# Altium schematic symbol library AD_Lib.SchLib: 1239 symbols (part 9 of 9) (continued)
## Visio_PS
designator PS?, comment PowerSupply  (value not drawn)
¼ÌµçÆ÷, 2NC2NO; Manufacturer: TE Connectivity; pro-environment: RoHS; Quality: -40~85¡æ; Vaule: 2A-30VDC, 5V; OPN: IM03GR; PadsNum: 0; SN: SN; Part: IM03GR; Category: ¼ÌµçÆ÷; QTY: 1000; Price: 15.8878; OPN_JLC: OPN_JLC; SN_JLC: SN_JLC; Price_JLC: 0
footprint IM_G (Footprint not found)
pins: 24V, 110V 1
text: Power

## Visio_RY1
designator RY?, comment LC1D18BD
¼ÌµçÆ÷, 2NC2NO; Manufacturer: TE Connectivity; pro-environment: RoHS; Quality: -40~85¡æ; Vaule: 2A-30VDC, 5V; OPN: IM03GR; PadsNum: 0; SN: SN; Part: IM03GR; Category: ¼ÌµçÆ÷; QTY: 1000; Price: 15.8878; OPN_JLC: OPN_JLC; SN_JLC: SN_JLC; Price_JLC: 0
footprint IM_G (Footprint not found)
part A pins: A1 IN+, A2 IN-
part B pins: 1L1, 2T1

## Visio_RY2
designator RY?, comment IM03GR
¼ÌµçÆ÷, 2NC2NO; Manufacturer: TE Connectivity; pro-environment: RoHS; Quality: -40~85¡æ; Vaule: 2A-30VDC, 5V; PadsNum: 0; SN: SN; OPN: IM03GR; Part: IM03GR; Category: ¼ÌµçÆ÷; QTY: 1000; Price: 15.8878; OPN_JLC: OPN_JLC; SN_JLC: SN_JLC; Price_JLC: 0
footprint IM_G (Footprint not found)
part A pins: 1 IN+, 8 IN-
part B pins: 2, 3, 4
part C pins: 5, 6, 7

## Visio_TimeSW
designator TR?, comment 3RP1525-1BW30
¼ÌµçÆ÷, 2NC2NO; Manufacturer: TE Connectivity; pro-environment: RoHS; Quality: -40~85¡æ; Vaule: 2A-30VDC, 5V; OPN: IM03GR; PadsNum: 0; SN: SN; Part: IM03GR; Category: ¼ÌµçÆ÷; QTY: 1000; Price: 15.8878; OPN_JLC: OPN_JLC; SN_JLC: SN_JLC; Price_JLC: 0
footprint IM_G (Footprint not found)
pins: 15 1, 18 2
text: Time; Relay

## Y_ABL-20.000MHZ-D2
designator Y?, comment 20MHz
¾§Õñ; Manufacturer: Abracon; Quality: -40~85¡æ; SN: 03.4.40.11.99200005S; pro-environment: RoHS; OPN: ABL-20.000MHZ-D2; other: ¸ºÔØµçÈÝ=18pF;ÈÝ²î=20ppm;ESR=40¦¸; PadsNum: 0; Category: ¾§Õñ; Part: 20MHz; Value: 20MHz; QTY: 1000; Price: 1.4274; OPN_JLC: OPN_JLC; SN_JLC: SN_JLC; Price_JLC: 0
footprint XTAL_TH (ÎÞÔ´¾§Õñ£¬Ö±²å)
pins: 1, 2

## Y_ABM3-10.0000MHZ-D2Y-T
designator Y?, comment 10MHz
¾§Õñ; Manufacturer: Abracon; Quality: -40~85¡æ; SN: 03.4.40.11.85100001S; pro-environment: RoHS; OPN: ABM3-10.0000MHZ-D2Y-T; other: ¸ºÔØµçÈÝ=18pF;ÈÝ²î=20ppm;ESR=60¦¸; PadsNum: 0; Category: ¾§Õñ; Part: 10MHz; Value: 10MHz; QTY: 1000; Price: ?; OPN_JLC: OPN_JLC; SN_JLC: SN_JLC; Price_JLC: 0
footprint ABM3 (ABM3-40.000MHZ-D2Y-T)
pins: 1, 2

## Y_ABM3-25.000MHZ-D2Y-T
designator Y?, comment 25MHz
¾§Õñ; Manufacturer: Abracon; Quality: -40~85¡æ; pro-environment: RoHS; OPN: ABM3-25.000MHZ-D2Y-T; other: ¸ºÔØµçÈÝ=18pF;ÈÝ²î=20ppm;ESR=30¦¸; PadsNum: 2; SN: SN; Category: ¾§Õñ; Part: 25MHz; Value: 25MHz; QTY: 1000; Price: -; OPN_JLC: X503225MSB2GI; SN_JLC: C112569; Price_JLC: 1.0077
footprint Y_SMD5032 (ABM3-40.000MHZ-D2Y-T£¬5032·â×°)
pins: 1, 2

## Y_ABM3-40.000MHZ-D2Y-T
designator Y?, comment 40MHz
¾§Õñ; Manufacturer: Abracon; Quality: -40~85¡æ; SN: 03.4.30.11.12040M01S; pro-environment: RoHS; OPN: ABM3-40.000MHZ-D2Y-T; PadsNum: 0; Part: 40MHz; Category: ¾§Õñ; Value: 40MHz; QTY: 1000; Price: ?; OPN_JLC: OPN_JLC; SN_JLC: SN_JLC; Price_JLC: 0
footprint ABM3 (ABM3-40.000MHZ-D2Y-T)
pins: 1, 2

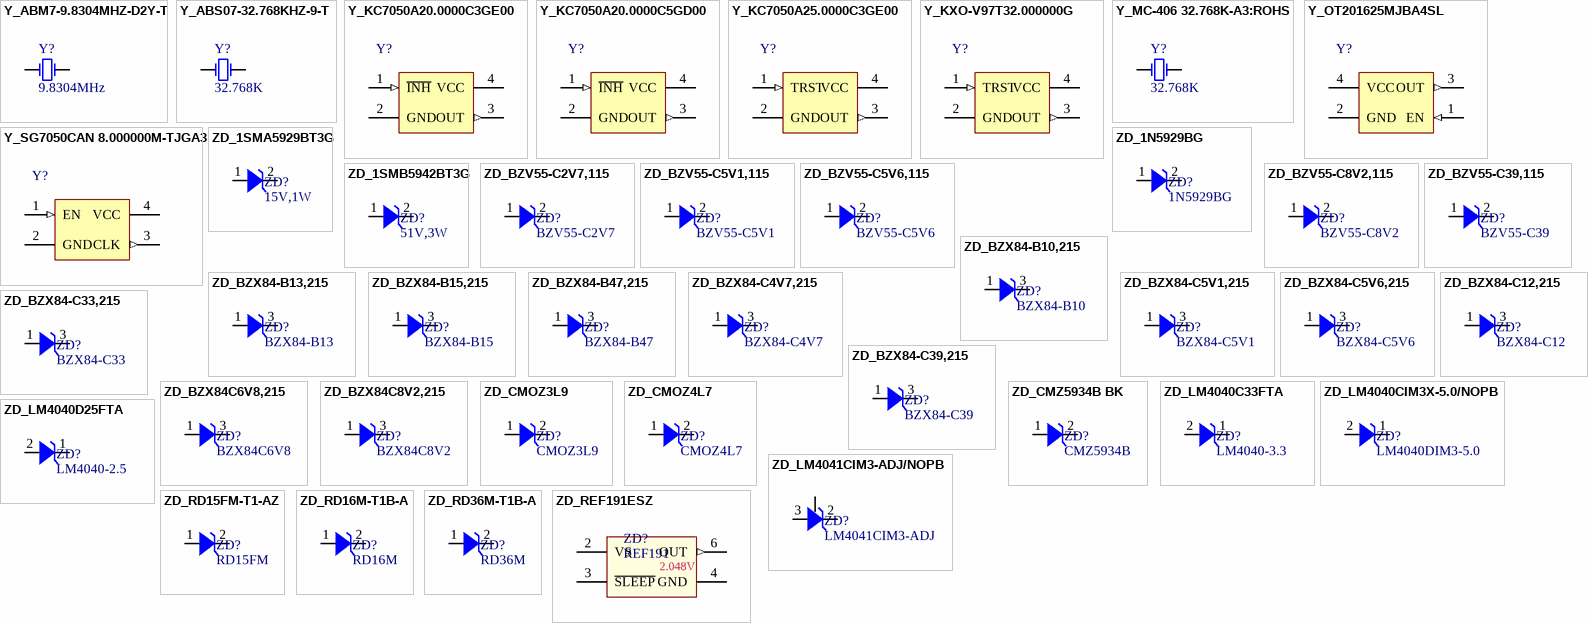
[diagram p41: symbols Y_ABM7-9.8304MHZ-D2Y-T to ZD_REF191ESZ]

## Y_ABM7-9.8304MHZ-D2Y-T
designator Y?, comment 9.8304MHz
¾§Õñ; Manufacturer: Abracon; Quality: -40~85¡æ; SN: 03.4.40.11.85983401S; pro-environment: RoHS; OPN: ABM7-9.8304MHZ-D2Y-T; other: ¸ºÔØµçÈÝ=18pF;ÈÝ²î=20ppm;ESR=100¦¸; PadsNum: 0; Category: ¾§Õñ; Part: 9.8304MHz; Value: 9.8304MHz; QTY: 1000; Price: ?; OPN_JLC: OPN_JLC; SN_JLC: SN_JLC; Price_JLC: 0
footprint ABM7
pins: 1, 2

## Y_ABS07-32.768KHZ-9-T
designator Y?, comment 32.768K
¾§Õñ; 32.768kHz;; Manufacturer: Abracon; Quality: -40~85¡æ; pro-environment: RoHS; OPN: ABS07-32.768KHZ-9-T; other: ÈÝ²î=20ppm;ÆµÂÊÎÈ¶¨ÐÔ=20ppm; PadsNum: 2; SN: SN; Category: ¾§Õñ; Part: 32.768K; Value: 32.768KHz; QTY: 3000; Price: 2.8665; OPN_JLC: SF32WK32768D31T002; SN_JLC: C271654; Price_JLC: 1.71
footprint Y_SMD3215 (Footprint not found)
pins: 1, 2

## Y_KC7050A20.0000C3GE00
designator Y?, comment 20M,5V  (value not drawn)
¾§Õñ,ÓÐÔ´,20MHz,3.14~3.46V; Manufacturer: AVX; Quality: -40~85¡æ; SN: 03.4.40.11.99200002S; OPN: KC7050A20.0000C3GE00; Other: 20M,3.3V,50ppm; Pro-environment: RoHS; PadsNum: 0; Value: 20M,5V; Category: ¾§Õñ; Part: KC7050A20.0000C3GE00; QTY: 1000; Price: 7.1604; OPN_JLC: OPN_JLC; SN_JLC: SN_JLC; Price_JLC: 0
footprint Y_7050 (Footprint not found)
pins: 1 ~{INH} (in), 2 GND (power), 3 OUT (out), 4 VCC (power)

## Y_KC7050A20.0000C5GD00
designator Y?, comment 20M,5V  (value not drawn)
¾§Õñ,ÓÐÔ´,20MHz,4.5~5.5V; Manufacturer: AVX; Quality: -40~85¡æ; SN: 03.4.40.11.99200003S; OPN: KC7050A20.0000C5GD00; Other: 20M,5V,50ppm; Pro-environment: RoHS; PadsNum: 0; Value: 20M,5V; Category: ¾§Õñ; Part: KC7050A20.0000C5GD00; QTY: 1000; Price: 14.0166; OPN_JLC: OPN_JLC; SN_JLC: SN_JLC; Price_JLC: 0
footprint Y_7050 (AVXÖ®KC7050AÏµÁÐÓÐÔ´¾§Õñ£¬7.0¡Á5.0mm SMD)
pins: 1 ~{INH} (in), 2 GND (power), 3 OUT (out), 4 VCC (power)

## Y_KC7050A25.0000C3GE00
designator Y?, comment 25MHz,3.3V  (value not drawn)
¾§Õñ;ÓÐÔ´;25MHz;3.3V; Manufacturer: AVX; Quality: -40~85¡æ; OPN: KC7050A25.0000C3GE00; Pro-environment: RoHS; PadsNum: 0; Value: 25MHz,3.3V; SN: SN; Category: ¾§Õñ; Other: 25MHz,3.3V; Part: KC7050A25.0000C3GE00; QTY: 1000; Price: 7.3827; OPN_JLC: OPN_JLC; SN_JLC: SN_JLC; Price_JLC: 0
footprint Y_7050 (AVXÖ®KC7050AÏµÁÐÓÐÔ´¾§Õñ£¬7.0¡Á5.0mm SMD)
pins: 1 TRST (in), 2 GND (power), 3 OUT (out), 4 VCC (power)

## Y_KXO-V97T32.000000G
designator Y?, comment 32M,3.3V  (value not drawn)
¾§Õñ;ÓÐÔ´;32M;3.3V; Manufacturer: Keyer; Quality: -40~85¡æ; OPN: KXO-V97T32.000000G; Pro-environment: RoHS; PadsNum: 0; Value: 32M,3.3V; SN: SN; Category: ¾§Õñ; Other: 32M,3.3V; Part: KXO-V97T32.000000G; QTY: 1000; Price: ?; OPN_JLC: OPN_JLC; SN_JLC: SN_JLC; Price_JLC: 0
footprint Y_7050 (AVXÖ®KC7050AÏµÁÐÓÐÔ´¾§Õñ£¬7.0¡Á5.0mm SMD)
pins: 1 TRST (in), 2 GND (power), 3 OUT (out), 4 VCC (power)

## Y_MC-406 32.768K-A3:ROHS
designator Y?, comment 32.768K
¾§Õñ; Manufacturer: Epson; Quality: -40~85¡æ; SN: 03.4.40.11.99MC4001S; pro-environment: RoHS; OPN: MC-406 32.768K-A3:ROHS; Value: 32.768KHz; other: ÈÝ²î=20ppm;ÆµÂÊÎÈ¶¨ÐÔ=100ppm; PadsNum: 0; Category: ¾§Õñ; Part: 32.768K; QTY: 250; Price: 5.6745; OPN_JLC: OPN_JLC; SN_JLC: SN_JLC; Price_JLC: 0
footprint MC406 (EpsonÖ®MC406ÏµÁÐ¾§Õñ£¬10.41*4.06*3.6mm)
pins: 1, 4

## Y_OT201625MJBA4SL
designator Y?, comment 25MHz,3.3V  (value not drawn)
¾§Õñ; ÓÐÔ´; 25MHz; 1.8~3.3V; Manufacturer: YXCÑïÐË¿Æ¼¼; Quality: -40~85¡æ; OPN: OT201625MJBA4SL; Pro-environment: RoHS; PadsNum: 4; Value: 25MHz,3.3V; SN: SN; Category: ¾§Õñ; Other: 25MHz,3.3V; Part: OT201625MJBA4SL; QTY: 1000; Price: 3.11; OPN_JLC: OT201625MJBA4SL; SN_JLC: C669080; Price_JLC: 3.11
footprint Y_2016 (4PÓÐÔ´¾§Õñ£¬2.0¡Á1.6mm SMD)
pins: 1 EN (in), 2 GND (power), 3 OUT (out), 4 VCC (power)

## Y_SG7050CAN 8.000000M-TJGA3
designator Y?, comment 8M,2.5V  (value not drawn)
¾§Õñ:ÓÐÔ´;8M;2.5V; Manufacturer: EPSON; Quality: -40~85¡æ; OPN: SG7050CAN 8.000000M-TJGA3; Pro-environment: RoHS; PadsNum: 0; Value: 8M,2.5V; SN: SN; Category: ¾§Õñ; Other: 8M,2.5V; Part: SG7050CAN 8.000000M-TJGA3; Price: ?; OPN_JLC: OPN_JLC; SN_JLC: SN_JLC; Price_JLC: 0
footprint Y_7050 (AVXÖ®KC7050AÏµÁÐÓÐÔ´¾§Õñ£¬7.0¡Á5.0mm SMD)
pins: 1 EN (in), 2 GND (power), 3 CLK (out), 4 VCC (power)

## ZD_1N5929BG
designator ZD?, comment 1N5929BG
ÎÈÑ¹¶þ¼«¹Ü,15V,3W; Manufacturer: Renesas; pro-environment: RoHS; Quality: -65~200¡æ; SN: 03.4.21.13.99592901S; Value: 15V,3W; other: Tol=5%; PadsNum: 0; OPN: 1N5929BG; Part: 1N5929BG; Category: ÎÈÑ¹¶þ¼«¹Ü; QTY: 2000; Price: 0.6552; OPN_JLC: OPN_JLC; SN_JLC: SN_JLC; Price_JLC: 0
footprint DO-41B (Diode, Axial; Body 5.2 x 2.7 mm (LxDia. max), Lead Dia. 0.86 mm (max))
pins: 1 "A", 2 "K"

## ZD_1SMA5929BT3G
designator ZD?, comment 15V,1W
ÎÈÑ¹¶þ¼«¹Ü; 15V; 5%; 1.5W; Manufacturer: ON; pro-environment: RoHS; Quality: -65~150¡æ; OPN: 1SMA5929BT3G; other: Tol=5%; PadsNum: 2; SN: SN; Value: 15V,1W; Part: 15V,1W; Category: ÎÈÑ¹¶þ¼«¹Ü; QTY: 5000; Price: 0.70964; OPN_JLC: 1SMA5929BT3G; SN_JLC: C32357; Price_JLC: 0.466469
footprint SMA (DO-214-AC/SMA)
pins: 1 "A", 2 "K"

## ZD_1SMB5942BT3G
designator ZD?, comment 51V,3W
ÎÈÑ¹¶þ¼«¹Ü; 51V; 5%; 3W; Manufacturer: ON; pro-environment: RoHS; Quality: -65~150¡æ; OPN: 1SMB5942BT3G; other: Tol=5%; PadsNum: 2; SN: SN; Value: 51V,3W; Part: 51V,3W; Category: ÎÈÑ¹¶þ¼«¹Ü; QTY: 2500; Price: 0.79439; OPN_JLC: 1SMB5942BT3G; SN_JLC: C152465; Price_JLC: 0.7161
footprint SMB (DO-214-AA/SMB)
pins: 1 "A", 2 "K"

## ZD_BZV55-C2V7,115
designator ZD?, comment BZV55-C2V7
ÎÈÑ¹¶þ¼«¹Ü,2.9V; 0.5W; Manufacturer: Nexperia; pro-environment: RoHS; Quality: -55~150¡æ; SN: 03.4.21.13.99C2V701S; Value: 2.9V,0.5W; OPN: BZV55-C2V7,115; other: Vz=2.9V;ÈÝ²î=5%; PadsNum: 0; Part: BZV55-C2V7; Category: ÎÈÑ¹¶þ¼«¹Ü; QTY: 2500; Price: 0.25038; OPN_JLC: OPN_JLC; SN_JLC: SN_JLC; Price_JLC: 0
footprint SOD-80 (Footprint not found)
pins: 1 "A", 2 "K"

## ZD_BZV55-C5V1,115
designator ZD?, comment BZV55-C5V1
ÎÈÑ¹¶þ¼«¹Ü; 5.1V; 0.5W; Manufacturer: Nexperia; pro-environment: RoHS; Quality: -55~150¡æ; SN: 03.4.21.13.99C5V101S; Value: 5.1V,0.5W; OPN: BZV55-C5V1,115; other: ÈÝ²î=5%; PadsNum: 0; Part: BZV55-C5V1; Category: ÎÈÑ¹¶þ¼«¹Ü; QTY: 2500; Price: 0.25038; OPN_JLC: OPN_JLC; SN_JLC: SN_JLC; Price_JLC: 0
footprint SOD-80 (Footprint not found)
pins: 1 "A", 2 "K"

## ZD_BZV55-C5V6,115
designator ZD?, comment BZV55-C5V6
ÎÈÑ¹¶þ¼«¹Ü; 5.6V; 0.5W; Manufacturer: Nexperia; pro-environment: RoHS; Quality: -55~150¡æ; SN: 03.4.21.13.99C5V601S; Value: 5.6V,0.5W; OPN: BZV55-C5V6,115; other: ÈÝ²î=5%; PadsNum: 0; Part: BZV55-C5V6; Category: ÎÈÑ¹¶þ¼«¹Ü; QTY: 2500; Price: 0.25038; OPN_JLC: OPN_JLC; SN_JLC: SN_JLC; Price_JLC: 0
footprint SOD-80 (Footprint not found)
pins: 1 "A", 2 "K"

## ZD_BZV55-C8V2,115
designator ZD?, comment BZV55-C8V2
ÎÈÑ¹¶þ¼«¹Ü;8.2V;0.5W; Manufacturer: Nexperia; pro-environment: RoHS; Quality: -55~150¡æ; Value: 8.2V,0.5W; OPN: BZV55-C8V2,115; other: Vz=8.2V;ÈÝ²î=5%; PadsNum: 0; SN: SN; Part: BZV55-C8V2; Category: ÎÈÑ¹¶þ¼«¹Ü; QTY: 2500; Price: 0.25038; OPN_JLC: OPN_JLC; SN_JLC: SN_JLC; Price_JLC: 0
footprint SOD-80 (Footprint not found)
pins: 1 "A", 2 "K"

## ZD_BZV55-C39,115
designator ZD?, comment BZV55-C39
ÎÈÑ¹¶þ¼«¹Ü,41V; Manufacturer: Nexperia; pro-environment: RoHS; Quality: -55~150¡æ; SN: 03.4.21.13.990C3901S; Value: 39V,0.5W; OPN: BZV55-C39,115; other: Vz=41V;ÈÝ²î=5%; PadsNum: 0; Part: BZV55-C39; Category: ÎÈÑ¹¶þ¼«¹Ü; QTY: 2500; Price: 0.25038; OPN_JLC: OPN_JLC; SN_JLC: SN_JLC; Price_JLC: 0
footprint SOD-80 (Footprint not found)
pins: 1 "A", 2 "K"

## ZD_BZX84-B10,215
designator ZD?, comment BZX84-B10
ÎÈÑ¹¶þ¼«¹Ü; Manufacturer: NXP; pro-environment: RoHS; Quality: -65~150¡æ; Value: 10V,0.25W; OPN: BZX84-B10,215; other: Tol=2%; PadsNum: 0; SN: SN; Part: BZX84-B10; Category: ÎÈÑ¹¶þ¼«¹Ü; QTY: 3000; Price: ?; OPN_JLC: OPN_JLC; SN_JLC: SN_JLC; Price_JLC: 0
footprint SOT23-3 (SOT-23; 3 Leads; Body 3.0 x 2.5 mm, inc. leads (LxW max))
pins: 1 "A", 3 "K"

## ZD_BZX84-B13,215
designator ZD?, comment BZX84-B13
ÎÈÑ¹¶þ¼«¹Ü; Manufacturer: NXP; pro-environment: RoHS; Quality: -65~125¡æ; SN: 03.4.21.13.48841301S; Value: 13V,0.25W; OPN: BZX84-B13,215; other: 2%;MARK=*Z8; PadsNum: 0; Part: BZX84-B13; Category: ÎÈÑ¹¶þ¼«¹Ü; QTY: 3000; Price: 0.25389; OPN_JLC: OPN_JLC; SN_JLC: SN_JLC; Price_JLC: 0
footprint SOT23-3 (SOT-23; 3 Leads; Body 3.0 x 2.5 mm, inc. leads (LxW max))
pins: 1 "A", 3 "K"

## ZD_BZX84-B15,215
designator ZD?, comment BZX84-B15
ÎÈÑ¹¶þ¼«¹Ü; Manufacturer: NXP; pro-environment: RoHS; Quality: -65~150¡æ; SN: 03.4.21.13.48841501S; Value: 15V,0.25W; OPN: BZX84-B15,215; other: Tol=2%; PadsNum: 0; Part: BZX84-B15; Category: ÎÈÑ¹¶þ¼«¹Ü; QTY: 3000; Price: ?; OPN_JLC: OPN_JLC; SN_JLC: SN_JLC; Price_JLC: 0
footprint SOT23-3 (SOT-23; 3 Leads; Body 3.0 x 2.5 mm, inc. leads (LxW max))
pins: 1 "A", 3 "K"

## ZD_BZX84-B47,215
designator ZD?, comment BZX84-B47
ÎÈÑ¹¶þ¼«¹Ü; Manufacturer: NXP; pro-environment: RoHS; Quality: -65~150¡æ; Value: 47V,0.25W; OPN: BZX84-B47,215; other: Tol=2%; PadsNum: 0; SN: SN; Part: BZX84-B47; Category: ÎÈÑ¹¶þ¼«¹Ü; QTY: 3000; Price: ?; OPN_JLC: OPN_JLC; SN_JLC: SN_JLC; Price_JLC: 0
footprint SOT23-3 (SOT-23; 3 Leads; Body 3.0 x 2.5 mm, inc. leads (LxW max))
pins: 1 "A", 3 "K"

## ZD_BZX84-C4V7,215
designator ZD?, comment BZX84-C4V7
ÎÈÑ¹¶þ¼«¹Ü; Manufacturer: NXP; pro-environment: RoHS; Quality: -65~125¡æ; Value: 4.7V,0.25W; OPN: BZX84-C4V7,215; PadsNum: 0; SN: SN; Part: BZX84-C4V7; Category: ÎÈÑ¹¶þ¼«¹Ü; QTY: 3000; Price: ?; OPN_JLC: OPN_JLC; SN_JLC: SN_JLC; Price_JLC: 0
footprint SOT23-3 (SOT-23; 3 Leads; Body 3.0 x 2.5 mm, inc. leads (LxW max))
pins: 1 "A", 3 "K"

## ZD_BZX84-C5V1,215
designator ZD?, comment BZX84-C5V1
ÎÈÑ¹¶þ¼«¹Ü; Manufacturer: NXP; pro-environment: RoHS; Quality: -65~125¡æ; SN: 03.4.21.13.48C5V102S; Value: 5.1V,0.25W; OPN: BZX84-C5V1,215; other: ÈÝ²î=5%; PadsNum: 0; Part: BZX84-C5V1; Category: ÎÈÑ¹¶þ¼«¹Ü; QTY: 3000; Price: ?; OPN_JLC: OPN_JLC; SN_JLC: SN_JLC; Price_JLC: 0
footprint SOT23-3 (SOT-23; 3 Leads; Body 3.0 x 2.5 mm, inc. leads (LxW max))
pins: 1 "A", 3 "K"

## ZD_BZX84-C5V6,215
designator ZD?, comment BZX84-C5V6
ÎÈÑ¹¶þ¼«¹Ü; Manufacturer: NXP; pro-environment: RoHS; Quality: -65~125¡æ; SN: 03.4.21.13.53C5V601S; Value: 5.6V,0.25W; OPN: BZX84-C5V6,215; other: ÈÝ²î=5%; PadsNum: 0; Part: BZX84-C5V6; Category: ÎÈÑ¹¶þ¼«¹Ü; QTY: 3000; Price: ?; OPN_JLC: OPN_JLC; SN_JLC: SN_JLC; Price_JLC: 0
footprint SOT23-3 (SOT-23; 3 Leads; Body 3.0 x 2.5 mm, inc. leads (LxW max))
pins: 1 "A", 3 "K"

## ZD_BZX84-C12,215
designator ZD?, comment BZX84-C12
ÎÈÑ¹¶þ¼«¹Ü; Manufacturer: NXP; pro-environment: RoHS; Quality: -65~125¡æ; Value: 12V,0.25W; OPN: BZX84-C12,215; other: 5%;MARK=Y2*; PadsNum: 0; SN: SN; Part: BZX84-C12; Category: ÎÈÑ¹¶þ¼«¹Ü; QTY: 3000; Price: ?; OPN_JLC: OPN_JLC; SN_JLC: SN_JLC; Price_JLC: 0
footprint SOT23-3 (SOT-23; 3 Leads; Body 3.0 x 2.5 mm, inc. leads (LxW max))
pins: 1 "A", 3 "K"

## ZD_BZX84-C33,215
designator ZD?, comment BZX84-C33
ÎÈÑ¹¶þ¼«¹Ü; Manufacturer: NXP; pro-environment: RoHS; Quality: -65~150¡æ; SN: 03.4.21.13.484C3301S; Value: 33V,0.25W; OPN: BZX84-C33,215; other: 5%;MARK=*T6; PadsNum: 0; Part: BZX84-C33; Category: ÎÈÑ¹¶þ¼«¹Ü; QTY: 3000; Price: 0.18486; OPN_JLC: OPN_JLC; SN_JLC: SN_JLC; Price_JLC: 0
footprint SOT23-3 (SOT-23; 3 Leads; Body 3.0 x 2.5 mm, inc. leads (LxW max))
pins: 1 "A", 3 "K"

## ZD_BZX84-C39,215
designator ZD?, comment BZX84-C39
ÎÈÑ¹¶þ¼«¹Ü; Manufacturer: NXP; pro-environment: RoHS; Quality: -55~150¡æ; SN: 03.4.21.13.484C3902S; Value: 39V,0.25W; OPN: BZX84-C39,215; other: 5%;MARK=*T8; PadsNum: 0; Part: BZX84-C39; Category: ÎÈÑ¹¶þ¼«¹Ü; QTY: 3000; Price: 0.19422; OPN_JLC: OPN_JLC; SN_JLC: SN_JLC; Price_JLC: 0
footprint SOT23-3 (SOT-23; 3 Leads; Body 3.0 x 2.5 mm, inc. leads (LxW max))
pins: 1 "A", 3 "K"

## ZD_BZX84C6V8,215
designator ZD?, comment BZX84C6V8
ÎÈÑ¹¶þ¼«¹Ü; Manufacturer: NXP; pro-environment: RoHS; Quality: -55~150¡æ; Value: 6.8V,0.25W; OPN: BZX84C6V8,215; other: ÈÝ²î=5%; PadsNum: 0; SN: SN; Part: BZX84C6V8; Category: ÎÈÑ¹¶þ¼«¹Ü; QTY: 3000; Price: 0.18486; OPN_JLC: OPN_JLC; SN_JLC: SN_JLC; Price_JLC: 0
footprint SOT23-3 (SOT-23; 3 Leads; Body 3.0 x 2.5 mm, inc. leads (LxW max))
pins: 1 "A", 3 "K"

## ZD_BZX84C8V2,215
designator ZD?, comment BZX84C8V2
ÎÈÑ¹¶þ¼«¹Ü; Manufacturer: NXP; pro-environment: RoHS; Quality: -55~150¡æ; Value: 8.2V,0.25W; OPN: BZX84C8V2,215; other: ÈÝ²î=5%; PadsNum: 0; SN: SN; Part: BZX84C8V2; Category: ÎÈÑ¹¶þ¼«¹Ü; QTY: 3000; Price: 0.18486; OPN_JLC: OPN_JLC; SN_JLC: SN_JLC; Price_JLC: 0
footprint SOT23-3 (SOT-23; 3 Leads; Body 3.0 x 2.5 mm, inc. leads (LxW max))
pins: 1 "A", 3 "K"

## ZD_CMOZ3L9
designator ZD?, comment CMOZ3L9
3.9V, 250mW, SURFACE MOUNT / LOW LEVEL SILICON ZENER DIODE; Manufacturer: ON; pro-environment: RoHS; Quality: -65~150°C; Value: 3V9,250mW; other: Tol=5%; PadsNum: 2; SN: SN; OPN: CMOZ3L9; Part: CMOZ3L9; Category: Zener Diodes; QTY: 5000; Price: 0.70964; OPN_JLC: CMOZ3L9; Price_JLC: 0.466469
footprint SOD523 (SOD-523; 2 Leads; Body 1.2x 0.8 mm, (LxW))
pins: 1 "A", 2 "K"

## ZD_CMOZ4L7
designator ZD?, comment CMOZ4L7
4.7V, 250mW, SURFACE MOUNT / LOW LEVEL SILICON ZENER DIODE; Manufacturer: ON; pro-environment: RoHS; Quality: -65~150°C; Value: 4V7,250mW; other: Tol=5%; PadsNum: 2; SN: SN; OPN: CMOZ4L7; Part: CMOZ4L7; Category: Zener Diodes; QTY: 5000; Price: 0.70964; OPN_JLC: CMOZ4L7; Price_JLC: 0.466469
footprint SOD523 (SOD-523; 2 Leads; Body 1.2x 0.8 mm, (LxW))
pins: 1 "A", 2 "K"

## ZD_CMZ5934B BK
designator ZD?, comment CMZ5934B
ÎÈÑ¹¶þ¼«¹Ü; Manufacturer: Central; pro-environment: RoHS; Quality: -55~150¡æ; Value: 24V,1.5W; OPN: CMZ5934B BK; other: Tol=5%; PadsNum: 0; SN: SN; Part: CMZ5934B; Category: ÎÈÑ¹¶þ¼«¹Ü; QTY: 800; Price: 3.3462; OPN_JLC: OPN_JLC; SN_JLC: SN_JLC; Price_JLC: 0
footprint SMA (DO-214-AC/SMA)
pins: 1 "A", 2 "K"

## ZD_LM4040C33FTA
designator ZD?, comment LM4040-3.3
µçÑ¹²Î¿¼Ô´; 3.3V; 15mA; 0.5%; Manufacturer: TI; pro-environment: RoHS; Quality: -40~125¡æ; Value: 3.3V,15mA; OPN: LM4040C33FTA; other: Vref=3.3V;Ir=62uA~15mA; 0.5%;100ppm;; PadsNum: 3; SN: SN; Part: LM4040-3.3; Category: ÎÈÑ¹¶þ¼«¹Ü; QTY: 3000; Price: 1.8645; OPN_JLC: OPN_JLC; SN_JLC: SN_JLC; Price_JLC: -
footprint SOT23-3 (SOT-23; 3 Leads; Body 3.0 x 2.5 mm, inc. leads (LxW max))
pins: 1 "K", 2 "A"

## ZD_LM4040CIM3X-5.0/NOPB
designator ZD?, comment LM4040DIM3-5.0
µçÑ¹²Î¿¼Ô´,5.0V,15mA,0.5%; Manufacturer: TI; pro-environment: RoHS; Quality: -40~85¡æ; SN: 03.4.11.13.48M32501S; OPN: LM4040CIM3X-5.0/NOPB; other: Vref=5.0V;Ir=15mA; 0.5%;150ppm;; PadsNum: 0; Value: 5.0V,15mA; Part: LM4040DIM3-5.0; Category: ÎÈÑ¹¶þ¼«¹Ü; QTY: 3000; Price: 1.8984; OPN_JLC: OPN_JLC; SN_JLC: SN_JLC; Price_JLC: 0
footprint SOT23-3 (SOT-23; 3 Leads; Body 3.0 x 2.5 mm, inc. leads (LxW max))
pins: 1 "K", 2 "A"

## ZD_LM4040D25FTA
designator ZD?, comment LM4040-2.5
µçÑ¹²Î¿¼Ô´; 2.5V; 15mA; 1%; Manufacturer: Diodes; pro-environment: RoHS; Quality: -40~125¡æ; Value: 2.5V,15mA; OPN: LM4040D25FTA; other: Vref=2.5V;Ir=60uA~15mA; 1%; 150ppm;; PadsNum: 3; SN: SN; Part: LM4040-2.5; Category: ÎÈÑ¹¶þ¼«¹Ü; QTY: 3000; Price: 1.4577; OPN_JLC: LM4040D25FTA; SN_JLC: C107244; Price_JLC: 1.71
footprint SOT23-3 (SOT-23; 3 Leads; Body 3.0 x 2.5 mm, inc. leads (LxW max))
pins: 1 "K", 2 "A"

## ZD_LM4041CIM3-ADJ/NOPB
designator ZD?, comment LM4041CIM3-ADJ
µçÑ¹²Î¿¼Ô´,1.24~10V,12mA; Manufacturer: TI; pro-environment: RoHS; Quality: -40~85¡æ; SN: 03.4.11.13.48404101S; OPN: LM4041CIM3-ADJ/NOPB; other: 1.24~10V;Ir=60uA~12mA; 0.5%;20ppm;; PadsNum: 0; Value: 1.24~10V,12mA; Part: LM4041CIM3-ADJ; Category: ÎÈÑ¹¶þ¼«¹Ü; QTY: 1000; Price: 3.0537; OPN_JLC: OPN_JLC; SN_JLC: SN_JLC; Price_JLC: 0
footprint SO-4W (Pitch=100mil£¬ÈçHCPL-181)
pins: 1 "FB", 2 "K", 3 "A"

## ZD_RD15FM-T1-AZ
designator ZD?, comment RD15FM
ÎÈÑ¹¶þ¼«¹Ü; Manufacturer: Renesas; pro-environment: RoHS; Quality: -55~150¡æ; SN: 03.4.21.13.45RD1501S; Value: 15V,1W; OPN: RD15FM-T1-AZ; other: Tol=?%; PadsNum: 0; Part: RD15FM; Category: ÎÈÑ¹¶þ¼«¹Ü; QTY: 3000; Price: ?; OPN_JLC: OPN_JLC; SN_JLC: SN_JLC; Price_JLC: 0
footprint SMB (DO-214-AA/SMB)
pins: 1 "A", 2 "K"

## ZD_RD16M-T1B-A
designator ZD?, comment RD16M
ÎÈÑ¹¶þ¼«¹Ü; Manufacturer: Renesas; pro-environment: RoHS; Quality: -55~150¡æ; SN: 03.4.21.13.21001601S; Value: 16V,1W; OPN: RD16M-T1B-A; other: Tol=?%; PadsNum: 0; Part: RD16M; Category: ÎÈÑ¹¶þ¼«¹Ü; QTY: 3000; Price: ?; OPN_JLC: OPN_JLC; SN_JLC: SN_JLC; Price_JLC: 0
footprint SMB (DO-214-AA/SMB)
pins: 1 "A", 2 "K"

## ZD_RD36M-T1B-A
designator ZD?, comment RD36M
ÎÈÑ¹¶þ¼«¹Ü; Manufacturer: Renesas; pro-environment: RoHS; Quality: -55~150¡æ; Value: 36V,1W; OPN: RD36M-T1B-A; other: Tol=?%; PadsNum: 0; SN: SN; Part: RD36M; Category: ÎÈÑ¹¶þ¼«¹Ü; QTY: 3000; Price: ?; OPN_JLC: OPN_JLC; SN_JLC: SN_JLC; Price_JLC: 0
footprint SMB (DO-214-AA/SMB)
pins: 1 "A", 2 "K"

## ZD_REF191ESZ
designator ZD?, comment REF191
µçÑ¹²Î¿¼Ô´,2.048V,30mA; Manufacturer: ADI; pro-environment: RoHS; Quality: -40~125¡æ; SN: 03.4.11.11.83191E01S; OPN: REF191ESZ; other: 2.048V,30mA; Vin<18V;5ppm; PadsNum: 0; Value: 2.048V,30mA; Part: REF191; Category: ÎÈÑ¹¶þ¼«¹Ü; QTY: 98; Price: 33.7896; OPN_JLC: OPN_JLC; SN_JLC: SN_JLC; Price_JLC: 0
footprint SO-8 (SOIC, 8-Leads, Body 4.9x3.9mm, Pitch 1.27mm, IPC Low Density)
pins: 2 VS (power), 3 ~{SLEEP} (oc), 4 GND (power), 6 OUT (out)
text: 2.048V

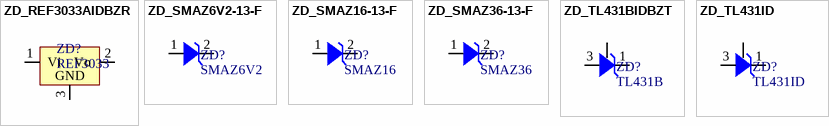
[diagram p42: symbols ZD_REF3033AIDBZR to ZD_TL431ID]

## ZD_REF3033AIDBZR
designator ZD?, comment REF3033
µçÑ¹²Î¿¼Ô´; 0.2%; 75ppm; 25mA; Manufacturer: TI; pro-environment: RoHS; Quality: -40~125¡æ; Value: 3.3V,25mA; OPN: REF3033AIDBZR; PadsNum: 3; SN: SN; Part: REF3033; Category: ÎÈÑ¹¶þ¼«¹Ü; QTY: 3000; other: 0.2%;75ppm;25mA; Price: 4.1923; OPN_JLC: REF3033AIDBZR; SN_JLC: C36658; Price_JLC: 4.08
footprint SOT23-3 (SOT-23; 3 Leads; Body 3.0 x 2.5 mm, inc. leads (LxW max))
pins: 1 Vi, 2 Vo, 3 GND (power)

## ZD_SMAZ6V2-13-F
designator ZD?, comment SMAZ6V2
ÎÈÑ¹¶þ¼«¹Ü,6.2V,1W; Manufacturer: Diodes; pro-environment: RoHS; Quality: -65~150¡æ; OPN: SMAZ6V2-13-F; other: Tol=5%; PadsNum: 0; SN: SN; Value: 6.2V,1W; Part: SMAZ6V2; Category: ÎÈÑ¹¶þ¼«¹Ü; QTY: 5000; Price: 0.79209; OPN_JLC: OPN_JLC; SN_JLC: SN_JLC; Price_JLC: 0
footprint SMA (DO-214-AC/SMA)
pins: 1 "A", 2 "K"

## ZD_SMAZ16-13-F
designator ZD?, comment SMAZ16
ÎÈÑ¹¶þ¼«¹Ü,16V,1W; Manufacturer: Diodes; pro-environment: RoHS; Quality: -65~150¡æ; Value: 16V,1W; OPN: SMAZ16-13-F; other: Tol=5%; PadsNum: 0; SN: SN; Part: SMAZ16; Category: ÎÈÑ¹¶þ¼«¹Ü; QTY: 5000; Price: 0.75231; OPN_JLC: OPN_JLC; SN_JLC: SN_JLC; Price_JLC: 0
footprint SMA (DO-214-AC/SMA)
pins: 1 "A", 2 "K"

## ZD_SMAZ36-13-F
designator ZD?, comment SMAZ36
ÎÈÑ¹¶þ¼«¹Ü,36V,1W; Manufacturer: Diodes; pro-environment: RoHS; Quality: -65~150¡æ; Value: 36V,1W; OPN: SMAZ36-13-F; other: Tol=5%; PadsNum: 0; SN: SN; Part: SMAZ36; Category: ÎÈÑ¹¶þ¼«¹Ü; QTY: 5000; Price: 0.79209; OPN_JLC: OPN_JLC; SN_JLC: SN_JLC; Price_JLC: 0
footprint SMA (DO-214-AC/SMA)
pins: 1 "A", 2 "K"

## ZD_TL431BIDBZT
designator ZD?, comment TL431B
µçÑ¹²Î¿¼Ô´; 0.5%;34ppm;0.1A; Manufacturer: TI; pro-environment: RoHS; Quality: -40~85¡æ; Value: 47V,0.25W; OPN: TL431BIDBZT; other: Vin<37V;Vout<36V; 0.5%;34ppm;0.1A; PadsNum: 0; SN: SN; Part: TL431B; Category: ÎÈÑ¹¶þ¼«¹Ü; QTY: 250; Price: ?; OPN_JLC: OPN_JLC; SN_JLC: SN_JLC; Price_JLC: 0
footprint SOT23-3 (SOT-23; 3 Leads; Body 3.0 x 2.5 mm, inc. leads (LxW max))
pins: 1 "K", 2 "K", 3 "A"

## ZD_TL431ID
designator ZD?, comment TL431ID
µçÑ¹²Î¿¼Ô´; 2%;92ppm;0.1A; Manufacturer: TI; pro-environment: RoHS; Quality: -40~125¡æ; Value: 47V,0.25W; other: Vin<37V;Vout<36V; 2%;92ppm;0.1A; PadsNum: 0; SN: SN; OPN: TL431ID; Part: TL431ID; Category: ÎÈÑ¹¶þ¼«¹Ü; QTY: 75; Price: 1.404; OPN_JLC: OPN_JLC; SN_JLC: SN_JLC; Price_JLC: 0
footprint TL431ID (Footprint not found)
pins: 1 "K", 2 "A", 3 "A", 6 "A", 7 "A", 8 "K"